# Altium footprint library ICL_komponenty_v1.PcbLib: 160 footprints (part 6 of 10)
Each footprint in its own frame and in the unit in brackets; x right, y up, seen from the top. Pads: shape width x height; smd on the part's side, far side on the other; paste and mask are expansions set on the pad; w line width, h text height; cw(c..) or ccw(c..) is an arc to the next point about the centre after c.
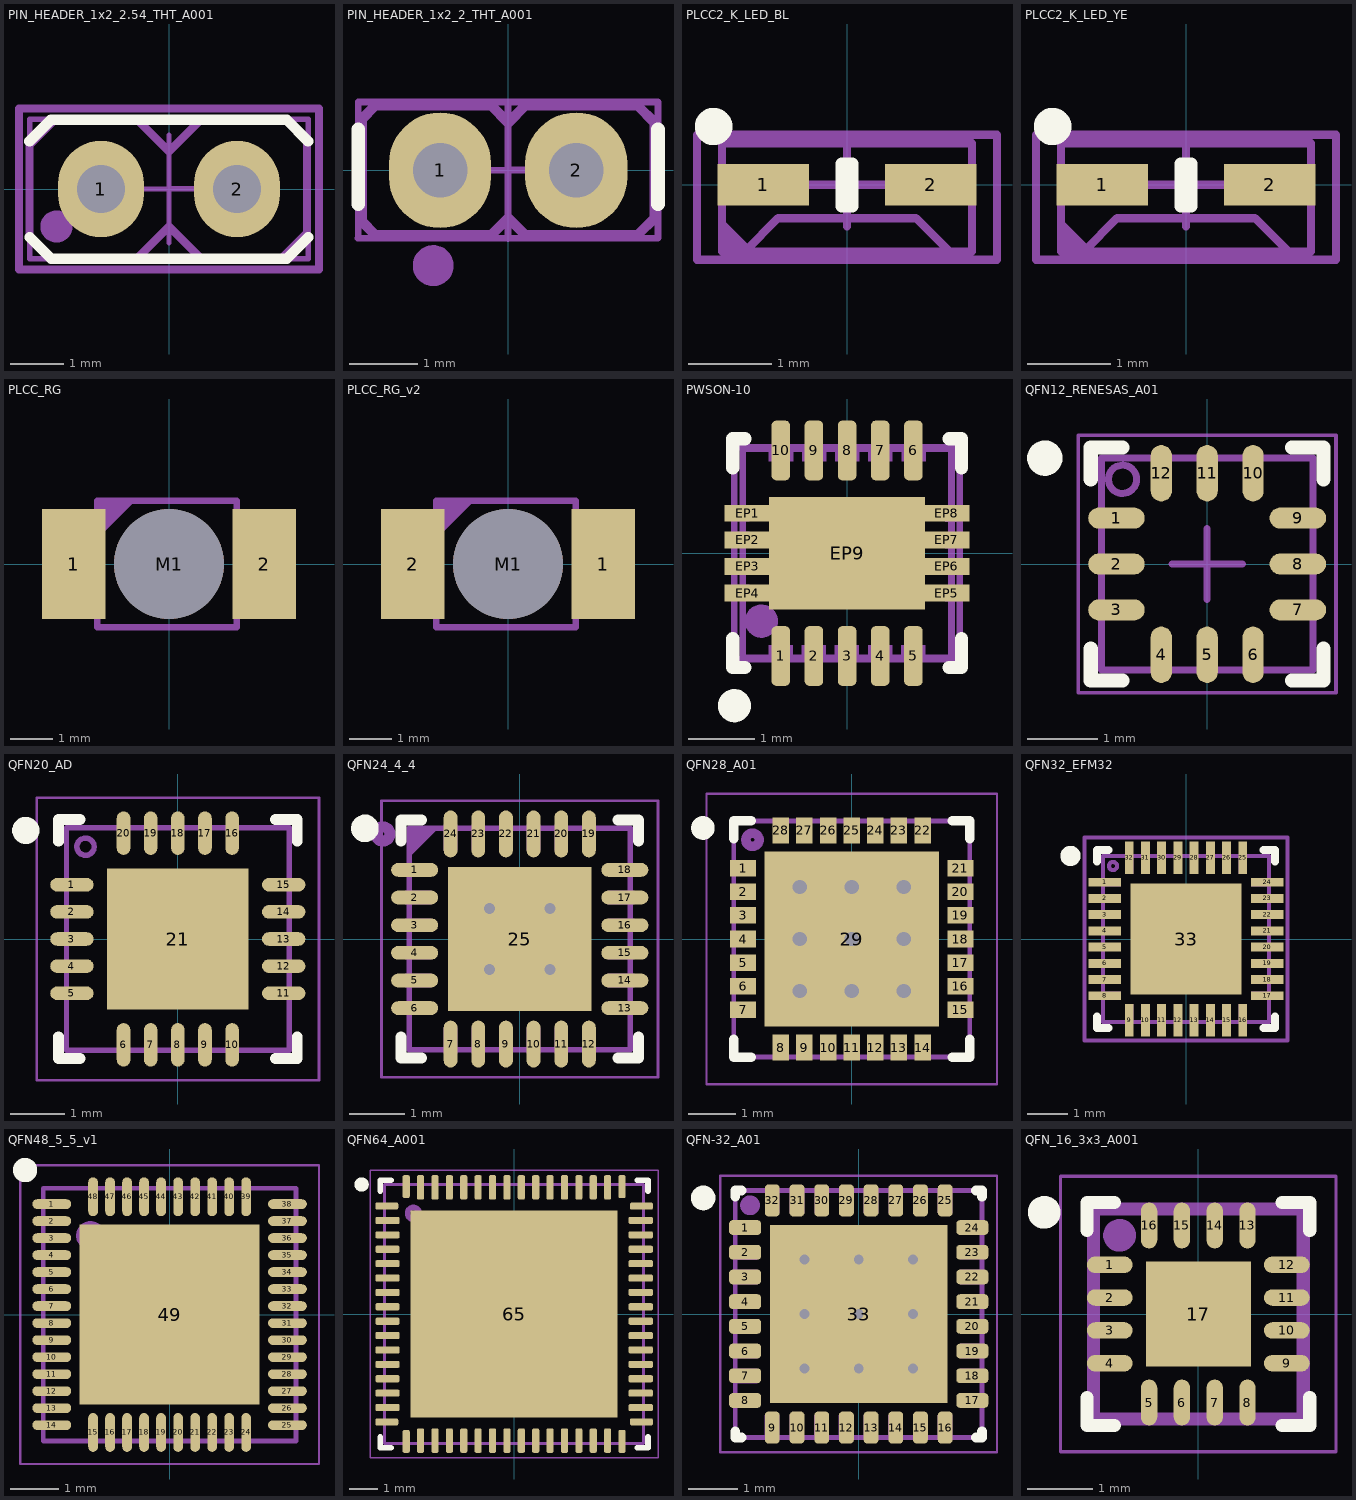
[diagram p5: the footprints below, top view; thin cyan lines are the x and y axes]

## PIN_HEADER_1x2_2.54_THT_A001 [mm]
pads (2):
  oval 1.6x1.8 hole 0.9: 1(-1.27,0) 2(1.27,0)
Top Overlay:
  lines w0.2: -2.603,0.893 -2.203,1.293 2.197,1.293 2.597,0.893 ; -2.6,-0.9 -2.2,-1.3 2.2,-1.3 2.6,-0.9
Top M15-16_SORG:
  lines w0.1: -1,0 0,0 ; 0,-1 0,0 ; 0,1 0,0 ; 0.009,0.004 1.009,0.004 ; -2.6,-1.3 2.6,-1.3 2.6,1.3 -2.6,1.3 -2.6,-1.3
Top M17-18_TDES:
  text "'.Designator'" at -5.465,2.483 h1
Top M19-20_TMOT:
  circle w0.3: c-2.1,-0.7 r0.15
  lines w0.15: 2.578,-0.823 2.102,-1.3 0.6,-1.3 0,-0.7 -0.6,-1.3 -2.2,-1.3 -2.6,-0.9 -2.6,0.823 -2.123,1.3 -0.6,1.3 0,0.7 0.6,1.3 2.2,1.3 2.579,0.921 2.579,-0.823 ; -1.708,-0.412 -1.708,0.388 ; -1.708,-0.412 -0.908,0.388 ; -1.708,-0.412 -0.908,-0.412 ; -1.708,0.388 -0.908,-0.412 ; -1.708,0.388 -0.908,0.388 ; -0.908,-0.412 -0.908,0.388 ; 0.875,-0.406 0.875,0.394 ; 0.875,-0.406 1.675,0.394 ; 0.875,-0.406 1.675,-0.406 ; 0.875,0.394 1.675,-0.406 ; 0.875,0.394 1.675,0.394 ; 1.675,-0.406 1.675,0.394 ; -2.8,-1.5 2.8,-1.5 2.8,1.5 -2.8,1.5 -2.8,-1.5
3D body "pin_header_1x2_2mm_THT.stp": height 8.55, standoff -2.99, extent -2.54,-1.27 2.54,1.27

## PIN_HEADER_1x2_2_THT_A001 [mm]
pads (2):
  oval 1.5x1.7 hole 0.8: 1(-1,0) 2(1,0)
Top Overlay:
  lines w0.2: -2.2,-0.5 -2.2,0.6 ; 2.2,-0.5 2.2,0.6
Top M15-16_SORG:
  lines w0.1: -2.204,-0.999 2.196,-0.999 ; -2.2,-0.995 -2.2,1 2.2,1 2.2,-0.995 ; -1,0 0,0 ; 0,-1 0,0 ; 0,1 0,0 ; 0.009,0.004 1.009,0.004
Top M17-18_TDES:
  text "'.Designator'" at -5.565,1.733 h1
Top M19-20_TMOT:
  circle w0.3: c-1.1,-1.4 r0.15
  lines w0.15: -1.4,-0.4 -1.4,0.4 ; -1.4,-0.4 -0.6,0.4 ; -1.4,-0.4 -0.6,-0.4 ; -1.4,0.4 -0.6,-0.4 ; -1.4,0.4 -0.6,0.4 ; -0.6,-0.4 -0.6,0.4 ; 0.6,-0.4 0.6,0.4 ; 0.6,-0.4 1.4,0.4 ; 0.6,-0.4 1.4,-0.4 ; 0.6,0.4 1.4,-0.4 ; 0.6,0.4 1.4,0.4 ; 1.4,-0.4 1.4,0.4 ; -2.15,-0.75 -2.15,0.75 -1.95,0.95 -0.25,0.95 0,0.7 0.25,0.95 1.9,0.95 2.15,0.7 2.15,-0.7 1.9,-0.95 0.25,-0.95 0,-0.7 -0.25,-0.95 -1.95,-0.95 -2.15,-0.75
3D body "2pin_jumper_62000211121.stp": height 6.01, standoff -2.69, extent -2,-1 2,1

## PLCC2_K_LED_BL [mm] "PLCC2 angle Blue"
height 0.381
pads (2):
  rect 1.1x0.5 smd: 1(-1.005,0) 2(1.005,0)
Top Overlay:
  circle w0.25: c-1.6,0.7 r0.1
  lines w0.152: -0.064,-0.254 0.064,-0.254 0.064,0.254 -0.064,0.254 -0.064,-0.254
Top M11-12_SMOT:
  region: -1.1,-0.8 -1.5,-0.4 -1.5,-0.8
  lines w0.1: -1.226,-0.8 -0.826,-0.4 0.826,-0.4 1.216,-0.789 1.216,-0.8 ; -1.5,-0.8 -1.5,0.5 1.5,0.5 1.5,-0.8 -1.5,-0.8
Top M13-14_SDES:
  text "'.Designator'" at -2.832,-0.208 h0.5
Top M15-16_SORG:
  lines w0.1: -0.5,0 0.5,0 ; 0,-0.5 0,0.5 ; -1.8,-0.9 -1.8,0.6 1.8,0.6 1.8,-0.9 -1.8,-0.9
3D body "PLCC2-3_1x1_4_BL.stp": height 1.54, standoff 0.01, extent -1.55,-0.8 1.55,0.4

## PLCC2_K_LED_YE [mm] "PLCC2 angle yelow"
height 0.381
pads (2):
  rect 1.1x0.5 smd: 1(-1.005,0) 2(1.005,0)
Top Overlay:
  circle w0.25: c-1.6,0.7 r0.1
  lines w0.152: -0.064,-0.254 -0.064,0.254 0.064,0.254 0.064,-0.254 -0.064,-0.254
Top M11-12_SMOT:
  region: -1.1,-0.8 -1.5,-0.4 -1.5,-0.8
  lines w0.1: -1.226,-0.8 -0.826,-0.4 0.826,-0.4 1.216,-0.789 1.216,-0.8 ; -1.5,-0.8 1.5,-0.8 1.5,0.5 -1.5,0.5 -1.5,-0.8
Top M13-14_SDES:
  text "'.Designator'" at -2.832,-0.208 h0.5
Top M15-16_SORG:
  lines w0.1: -0.5,0 0.5,0 ; 0,-0.5 0,0.5 ; -1.8,-0.9 1.8,-0.9 1.8,0.6 -1.8,0.6 -1.8,-0.9
3D body "PLCC2-3_1x1_4_YE.stp": height 1.54, standoff 0.01, extent -1.55,-0.8 1.55,0.4

## PLCC_RG [mm] "reverse mounting PLCC"
pads (3):
  rect 1.5x2.6 smd: 1(-2.25,0) 2(2.25,0)
  round 2.6 hole 2.6 unplated: M1(0,0)
Top M11-12_SMOT:
  circle w0.1: c0,0 r1.2
  region: -1.7,1.2 -2.5,1.2 -2.5,-1.2 -1.7,-1.2
  rectangle: 1.6,-1.2 2.5,1.2
  region: -1.7,1.5 -0.8,1.5 -1.7,0.6
  lines w0.15: -1.7,-1.5 1.6,-1.5 1.6,1.5 -1.7,1.5 -1.7,-1.5
Top M13-14_SDES:
  text "'.Designator'" at 0.25,-3.399 h0.6
Top M15-16_SORG:
  lines w0.1: -1,0 0,0 ; 0,-1 0,0 ; 0,1 0,0 ; 1,0 0,0
3D body "SFH_3211FA.STEP": height 1.84, standoff 0.01, extent -2.6,-1.4 2.6,1.4

## PLCC_RG_v2 [mm] "reverse mounting PLCC IR"
pads (3):
  rect 1.5x2.6 smd: 1(2.25,0) 2(-2.25,0)
  round 2.6 hole 2.6 unplated: M1(0,0)
Top M11-12_SMOT:
  circle w0.1: c0,0 r1.2
  rectangle: 1.6,-1.2 2.5,1.2
  region: -1.7,1.2 -2.5,1.2 -2.5,-1.2 -1.7,-1.2
  region: -1.7,1.5 -0.8,1.5 -1.7,0.6
  lines w0.15: -1.7,-1.5 -1.7,1.5 1.6,1.5 1.6,-1.5 -1.7,-1.5
Top M13-14_SDES:
  text "'.Designator'" at 0.25,-3.399 h0.6
Top M15-16_SORG:
  lines w0.1: -1,0 0,0 ; 0,-1 0,0 ; 0,1 0,0 ; 1,0 0,0
3D body "SFH_4253_R.STEP": height 1.84, standoff 0.01, extent -2.6,-1.4 2.6,1.4

## PWSON-10 [mm]
height 0.8
pads (19):
  rrect50% 0.28x0.9 smd: 1(-1,-1.55) 2(-0.5,-1.55) 3(0,-1.55) 4(0.5,-1.55) 5(1,-1.55) 6(1,1.55) 7(0.5,1.55) 8(0,1.55) 9(-0.5,1.55) 10(-1,1.55)
  rect 0.7x0.25 smd paste-0.2: EP1(-1.5,0.6) EP2(-1.5,0.2) EP3(-1.5,-0.2) EP4(-1.5,-0.6) EP5(1.5,-0.6) EP6(1.5,-0.2) EP7(1.5,0.2) EP8(1.5,0.6)
  rect 2.35x1.7 smd paste-1.2: EP9(0,0)
Top Overlay:
  circle w0.25: c-1.7,-2.3 r0.125
  lines w0.2: -1.725,-1.29 -1.725,-1.725 -1.54,-1.725 ; -1.725,1.29 -1.725,1.725 -1.54,1.725 ; 1.54,-1.725 1.725,-1.725 1.725,-1.29 ; 1.54,1.725 1.725,1.725 1.725,1.29
Top Paste:
  rectangle: -0.988,0.1 -0.1,0.7
  region: 0.988,-0.1 0.1,-0.1 0.1,-0.7 0.988,-0.7
  region: 0.988,0.7 0.1,0.7 0.1,0.1 0.988,0.1
  rectangle: -0.988,-0.7 -0.1,-0.1
  rectangle: 1.21,0.481 1.796,0.723
  rectangle: 1.21,0.081 1.796,0.323
  rectangle: 1.21,-0.319 1.796,-0.077
  rectangle: 1.21,-0.719 1.796,-0.477
  rectangle: -1.79,0.481 -1.204,0.723
  rectangle: -1.79,0.081 -1.204,0.323
  rectangle: -1.79,-0.319 -1.204,-0.077
  rectangle: -1.79,-0.719 -1.204,-0.477
Top Solder:
  rectangle: -1,1 1,2.1
  rectangle: -1,-2.1 1,-1
  rectangle: -1.174,-1.243 1.168,-0.676
  rectangle: -1.149,0.638 1.177,1.406
  lines w0.2: -1.594,-0.725 cw(c-1.594,-1.175) -1.144,-1.175 ; -1.589,0.722 ccw(c-1.589,1.172) -1.139,1.172 ; 1.139,-1.172 cw(c1.589,-1.172) 1.589,-0.722 ; 1.141,1.186 ccw(c1.591,1.186) 1.591,0.736
Top M11-12_SMOT:
  circle w0.25: c-1.292,-1.025 r0.125
  rectangle: -0.183,1.381 0.188,1.6
  region: 0.183,-1.381 -0.188,-1.381 -0.188,-1.6 0.183,-1.6
  region: 1.474,0.32 1.474,0.071 1.692,0.071 1.692,0.32
  region: 1.474,0.72 1.474,0.471 1.692,0.471 1.692,0.72
  rectangle: 0.817,1.381 1.188,1.6
  rectangle: 0.317,1.381 0.688,1.6
  region: 1.474,-0.48 1.474,-0.729 1.692,-0.729 1.692,-0.48
  region: 1.474,-0.08 1.474,-0.329 1.692,-0.329 1.692,-0.08
  region: 0.683,-1.381 0.312,-1.381 0.312,-1.6 0.683,-1.6
  region: 1.183,-1.381 0.812,-1.381 0.812,-1.6 1.183,-1.6
  region: -1.474,0.08 -1.474,0.329 -1.692,0.329 -1.692,0.08
  region: -1.474,0.48 -1.474,0.729 -1.692,0.729 -1.692,0.48
  rectangle: -0.683,1.381 -0.312,1.6
  rectangle: -1.183,1.381 -0.812,1.6
  region: -1.474,-0.72 -1.474,-0.471 -1.692,-0.471 -1.692,-0.72
  region: -1.474,-0.32 -1.474,-0.071 -1.692,-0.071 -1.692,-0.32
  region: -0.817,-1.381 -1.188,-1.381 -1.188,-1.6 -0.817,-1.6
  region: -0.317,-1.381 -0.688,-1.381 -0.688,-1.6 -0.317,-1.6
  lines w0.1: -1.7,-1.6 1.7,-1.6 1.7,1.6 -1.7,1.6 -1.7,-1.6
Top M13-14_SDES:
  text "'.Designator'" at -4.532,-0.333 h0.8
Top M15-16_SORG:
  lines w0.1: -0.5,0 0.5,0 ; 0,-0.5 0,0.5 ; -1.575,-1.575 1.575,-1.575 1.575,1.575 -1.575,1.575 -1.575,-1.575
3D body "PWSON-10.step": height 0.8, standoff 0, extent -1.576,-1.576 1.576,1.576

## QFN12_RENESAS_A01 [mm]
height 0.72
pads (12):
  oval 0.8x0.3 smd: 1(-1.285,0.65) 2(-1.285,0) 3(-1.285,-0.65) 7(1.285,-0.65) 8(1.285,0) 9(1.285,0.65)
  oval 0.3x0.8 smd: 4(-0.65,-1.285) 5(0,-1.285) 6(0.65,-1.285) 10(0.65,1.285) 11(0,1.285) 12(-0.65,1.285)
Top Overlay:
  circle w0.25: c-2.3,1.5 r0.125
  lines w0.2: -1.65,-1.2 -1.65,-1.65 -1.2,-1.65 ; -1.65,1.2 -1.65,1.65 -1.2,1.65 ; 1.2,-1.65 1.65,-1.65 1.65,-1.2 ; 1.2,1.65 1.65,1.65 1.65,1.2
Top M11-12_SMOT:
  circle w0.1: c-1.2,1.2 r0.2
  rectangle: -0.772,1.03 -0.531,1.5
  rectangle: -0.122,1.03 0.119,1.5
  rectangle: 0.528,1.03 0.769,1.5
  region: 1.03,0.772 1.03,0.531 1.5,0.531 1.5,0.772
  region: 1.03,0.122 1.03,-0.119 1.5,-0.119 1.5,0.122
  region: 1.03,-0.528 1.03,-0.769 1.5,-0.769 1.5,-0.528
  rectangle: 0.528,-1.54 0.769,-1.07
  rectangle: -0.122,-1.54 0.119,-1.07
  rectangle: -0.772,-1.54 -0.531,-1.07
  region: -1.54,-0.528 -1.54,-0.769 -1.07,-0.769 -1.07,-0.528
  region: -1.54,0.122 -1.54,-0.119 -1.07,-0.119 -1.07,0.122
  region: -1.54,0.772 -1.54,0.531 -1.07,0.531 -1.07,0.772
  lines w0.1: -1.5,-1.5 1.5,-1.5 1.5,1.5 -1.5,1.5 -1.5,-1.5
Top M13-14_SDES:
  text "'.Designator'" at -3.965,2.408 h0.7
Top M15-16_SORG:
  lines w0.05: -1.825,-1.825 1.825,-1.825 1.825,1.825 -1.825,1.825 -1.825,-1.825
  lines w0.1: -0.5,0 0.5,0 ; 0,-0.5 0,0.5
3D body "QFN127_RENESAS_A01.step": height 0.72, standoff 0, extent -1.537,-1.537 1.537,1.537

## QFN20_AD [mm] "AD8232"
height 0.8
pads (21):
  oval 0.8x0.25 smd: 1(-1.95,1) 2(-1.95,0.5) 3(-1.95,0) 4(-1.95,-0.5) 5(-1.95,-1) 11(1.95,-1) 12(1.95,-0.5) 13(1.95,0) 14(1.95,0.5) 15(1.95,1)
  oval 0.25x0.8 smd: 6(-1,-1.95) 7(-0.5,-1.95) 8(0,-1.95) 9(0.5,-1.95) 10(1,-1.95) 16(1,1.95) 17(0.5,1.95) 18(0,1.95) 19(-0.5,1.95) 20(-1,1.95)
  rect 2.6x2.6 smd: 21(0,0)
Top Overlay:
  circle w0.25: c-2.8,2 r0.125
  lines w0.2: -2.2,-1.8 -2.2,-2.2 -1.8,-2.2 ; -2.2,1.8 -2.2,2.2 -1.8,2.2 ; 1.8,-2.2 2.2,-2.2 2.2,-1.8 ; 1.8,2.2 2.2,2.2 2.2,1.8
Top M11-12_SMOT:
  circle w0.1: c-1.7,1.7 r0.158
  rectangle: -0.8,-0.7 0.7,0.7
  region: 1.6,1.1 1.6,0.9 2.05,0.9 2.05,1.1
  region: 1.6,0.6 1.6,0.4 2.05,0.4 2.05,0.6
  region: 1.6,0.1 1.6,-0.1 2.05,-0.1 2.05,0.1
  region: 1.6,-0.4 1.6,-0.6 2.05,-0.6 2.05,-0.4
  region: 1.6,-0.9 1.6,-1.1 2.05,-1.1 2.05,-0.9
  region: 1.1,-1.6 0.9,-1.6 0.9,-2.05 1.1,-2.05
  region: 0.6,-1.6 0.4,-1.6 0.4,-2.05 0.6,-2.05
  region: 0.1,-1.6 -0.1,-1.6 -0.1,-2.05 0.1,-2.05
  region: -0.4,-1.6 -0.6,-1.6 -0.6,-2.05 -0.4,-2.05
  region: -0.9,-1.6 -1.1,-1.6 -1.1,-2.05 -0.9,-2.05
  region: -1.6,-1.1 -1.6,-0.9 -2.05,-0.9 -2.05,-1.1
  region: -1.6,-0.6 -1.6,-0.4 -2.05,-0.4 -2.05,-0.6
  region: -1.6,-0.1 -1.6,0.1 -2.05,0.1 -2.05,-0.1
  region: -1.6,0.4 -1.6,0.6 -2.05,0.6 -2.05,0.4
  region: -1.6,0.9 -1.6,1.1 -2.05,1.1 -2.05,0.9
  rectangle: 0.9,1.6 1.1,2.05
  rectangle: 0.4,1.6 0.6,2.05
  rectangle: -0.1,1.6 0.1,2.05
  rectangle: -0.6,1.6 -0.4,2.05
  rectangle: -1.1,1.6 -0.9,2.05
  lines w0.1: -2.05,-2.05 2.05,-2.05 2.05,2.05 -2.05,2.05 -2.05,-2.05
Top M13-14_SDES:
  text "'.Designator'" at -3.399,0.85 h0.6
Top M15-16_SORG:
  lines w0.05: -2.6,-2.6 2.6,-2.6 2.6,2.6 -2.6,2.6 -2.6,-2.6
  lines w0.1: -0.5,0 0.5,0 ; 0,-0.5 0,0.5
3D body "QFN20_AD.step": height 0.8, standoff 0, extent -2.07,-2.07 2.07,2.07

## QFN24_4_4 [mm] "QFN, 24-Leads, Body 4,00x4,00mm, Pitch 0,50mm, Thermal Pad 2,60x2,60mm, IPC Medium Density"
height 0.9
pads (25):
  oval 0.85x0.25 smd: 1(-1.9,1.25) 2(-1.9,0.75) 3(-1.9,0.25) 4(-1.9,-0.25) 5(-1.9,-0.75) 6(-1.9,-1.25) 13(1.9,-1.25) 14(1.9,-0.75) 15(1.9,-0.25) 16(1.9,0.25) 17(1.9,0.75) 18(1.9,1.25)
  oval 0.25x0.85 smd: 7(-1.25,-1.9) 8(-0.75,-1.9) 9(-0.25,-1.9) 10(0.25,-1.9) 11(0.75,-1.9) 12(1.25,-1.9) 19(1.25,1.9) 20(0.75,1.9) 21(0.25,1.9) 22(-0.25,1.9) 23(-0.75,1.9) 24(-1.25,1.9)
  rect 2.6x2.6 smd: 25(0,0)
via 0.55,-0.55 diameter 0.5 hole 0.2
via -0.55,-0.55 diameter 0.5 hole 0.2
via 0.55,0.55 diameter 0.5 hole 0.2
via -0.55,0.55 diameter 0.5 hole 0.2
Top Overlay:
  circle w0.25: c-2.8,2 r0.125
  lines w0.2: -2.15,-1.775 -2.15,-2.15 -1.775,-2.15 ; -2.15,1.775 -2.15,2.15 -1.775,2.15 ; 1.775,-2.15 2.15,-2.15 2.15,-1.775 ; 1.775,2.15 2.15,2.15 2.15,1.775
Top M11-12_SMOT:
  circle w0.2: c-2.475,1.9 r0.127
  rectangle: -1.375,1.6 -1.125,2.075
  rectangle: -0.875,1.6 -0.625,2.075
  rectangle: -0.375,1.6 -0.125,2.075
  rectangle: 0.125,1.6 0.375,2.075
  rectangle: 0.625,1.6 0.875,2.075
  rectangle: 1.125,1.6 1.375,2.075
  region: 1.6,1.375 1.6,1.125 2.075,1.125 2.075,1.375
  region: 1.6,0.875 1.6,0.625 2.075,0.625 2.075,0.875
  region: 1.6,0.375 1.6,0.125 2.075,0.125 2.075,0.375
  region: 1.6,-0.125 1.6,-0.375 2.075,-0.375 2.075,-0.125
  region: 1.6,-0.625 1.6,-0.875 2.075,-0.875 2.075,-0.625
  region: 1.6,-1.125 1.6,-1.375 2.075,-1.375 2.075,-1.125
  region: 1.375,-1.6 1.125,-1.6 1.125,-2.075 1.375,-2.075
  region: 0.875,-1.6 0.625,-1.6 0.625,-2.075 0.875,-2.075
  region: 0.375,-1.6 0.125,-1.6 0.125,-2.075 0.375,-2.075
  region: -0.125,-1.6 -0.375,-1.6 -0.375,-2.075 -0.125,-2.075
  region: -0.625,-1.6 -0.875,-1.6 -0.875,-2.075 -0.625,-2.075
  region: -1.125,-1.6 -1.375,-1.6 -1.375,-2.075 -1.125,-2.075
  region: -1.6,-1.375 -1.6,-1.125 -2.075,-1.125 -2.075,-1.375
  region: -1.6,-0.875 -1.6,-0.625 -2.075,-0.625 -2.075,-0.875
  region: -1.6,-0.375 -1.6,-0.125 -2.075,-0.125 -2.075,-0.375
  region: -1.6,0.125 -1.6,0.375 -2.075,0.375 -2.075,0.125
  region: -1.6,0.625 -1.6,0.875 -2.075,0.875 -2.075,0.625
  region: -1.6,1.125 -1.6,1.375 -2.075,1.375 -2.075,1.125
  region: -2,2 -1.475,2 -1.999,1.476
  lines w0.1: -2,-2 2,-2 2,2 -2,2 -2,-2
Top M13-14_SDES:
  text "'.Designator'" at -3.399,-0.175 h0.6
Top M15-16_SORG:
  lines w0.05: -2.5,-2.5 2.5,-2.5 2.5,2.5 -2.5,2.5 -2.5,-2.5
  lines w0.1: -0.5,0 0.5,0 ; 0,-0.5 0,0.5
3D body "QFN24_4_4_b.step": height 0.9, standoff 0, extent -2.01,-2.01 2.01,2.01

## QFN28_A01 [mm] "Trinamic TMC2209"
height 0.9
pads (29):
  rect 0.55x0.35 smd: 1(-2.3,1.5) 2(-2.3,1) 3(-2.3,0.5) 4(-2.3,0) 5(-2.3,-0.5) 6(-2.3,-1) 7(-2.3,-1.5) 15(2.3,-1.5) 16(2.3,-1) 17(2.3,-0.5) 18(2.3,0) 19(2.3,0.5) 20(2.3,1) 21(2.3,1.5)
  rect 0.35x0.55 smd: 8(-1.5,-2.3) 9(-1,-2.3) 10(-0.5,-2.3) 11(0,-2.3) 12(0.5,-2.3) 13(1,-2.3) 14(1.5,-2.3) 22(1.5,2.3) 23(1,2.3) 24(0.5,2.3) 25(0,2.3) 26(-0.5,2.3) 27(-1,2.3) 28(-1.5,2.3)
  rect 3.7x3.7 smd paste-1.85: 29(0,0)
via -1.1,1.1 diameter 0.6 hole 0.3
via 0,1.1 diameter 0.6 hole 0.3
via 1.1,1.1 diameter 0.6 hole 0.3
via -1.1,0 diameter 0.6 hole 0.3
via 0,0 diameter 0.6 hole 0.3
via 1.1,0 diameter 0.6 hole 0.3
via -1.1,-1.1 diameter 0.6 hole 0.3
via 0,-1.1 diameter 0.6 hole 0.3
via 1.1,-1.1 diameter 0.6 hole 0.3
Top Overlay:
  circle w0.25: c-3.15,2.35 r0.125
  lines w0.2: -2.5,-2.125 -2.5,-2.5 -2.125,-2.5 ; -2.5,2.125 -2.5,2.5 -2.125,2.5 ; 2.125,-2.5 2.5,-2.5 2.5,-2.125 ; 2.125,2.5 2.5,2.5 2.5,2.125
Top Paste:
  region: 0.65,-0.65 0.65,-1.55 1.55,-1.55 1.55,-0.65
  region: -0.45,-0.65 -0.45,-1.55 0.45,-1.55 0.45,-0.65
  region: -1.55,-0.65 -1.55,-1.55 -0.65,-1.55 -0.65,-0.65
  region: -1.55,0.45 -1.55,-0.45 -0.65,-0.45 -0.65,0.45
  region: -1.55,1.55 -1.55,0.65 -0.65,0.65 -0.65,1.55
  region: 0.65,1.55 0.65,0.65 1.55,0.65 1.55,1.55
  region: -0.45,1.55 -0.45,0.65 0.45,0.65 0.45,1.55
  region: -0.45,0.45 -0.45,-0.45 0.45,-0.45 0.45,0.45
  region: 0.65,0.45 0.65,-0.45 1.55,-0.45 1.55,0.45
Top Solder:
  rectangle: -1.775,1.775 1.775,2.675
  rectangle: 1.775,-1.775 2.675,1.775
  rectangle: -1.775,-2.675 1.775,-1.775
  rectangle: -2.675,-1.775 -1.775,1.775
  rectangle: -1.95,-1.95 1.95,1.95
Top M11-12_SMOT:
  circle w0.2: c-2.1,2.1 r0.141
  region: -1.65,2.5 -1.65,2.05 -1.35,2.05 -1.35,2.5
  region: -1.15,2.5 -1.15,2.05 -0.85,2.05 -0.85,2.5
  region: -0.65,2.5 -0.65,2.05 -0.35,2.05 -0.35,2.5
  region: -0.15,2.5 -0.15,2.05 0.15,2.05 0.15,2.5
  region: 0.35,2.5 0.35,2.05 0.65,2.05 0.65,2.5
  region: 0.85,2.5 0.85,2.05 1.15,2.05 1.15,2.5
  region: 1.35,2.5 1.35,2.05 1.65,2.05 1.65,2.5
  rectangle: -2.5,-1.65 -2.05,-1.35
  rectangle: -2.5,-1.15 -2.05,-0.85
  rectangle: -2.5,-0.65 -2.05,-0.35
  rectangle: -2.5,-0.15 -2.05,0.15
  rectangle: -2.5,0.35 -2.05,0.65
  rectangle: -2.5,0.85 -2.05,1.15
  rectangle: -2.5,1.35 -2.05,1.65
  region: 1.65,-2.5 1.65,-2.05 1.35,-2.05 1.35,-2.5
  region: 1.15,-2.5 1.15,-2.05 0.85,-2.05 0.85,-2.5
  region: 0.65,-2.5 0.65,-2.05 0.35,-2.05 0.35,-2.5
  region: 0.15,-2.5 0.15,-2.05 -0.15,-2.05 -0.15,-2.5
  region: -0.35,-2.5 -0.35,-2.05 -0.65,-2.05 -0.65,-2.5
  region: -0.85,-2.5 -0.85,-2.05 -1.15,-2.05 -1.15,-2.5
  region: -1.35,-2.5 -1.35,-2.05 -1.65,-2.05 -1.65,-2.5
  region: 2.5,1.65 2.05,1.65 2.05,1.35 2.5,1.35
  region: 2.5,1.15 2.05,1.15 2.05,0.85 2.5,0.85
  region: 2.5,0.65 2.05,0.65 2.05,0.35 2.5,0.35
  region: 2.5,0.15 2.05,0.15 2.05,-0.15 2.5,-0.15
  region: 2.5,-0.35 2.05,-0.35 2.05,-0.65 2.5,-0.65
  region: 2.5,-0.85 2.05,-0.85 2.05,-1.15 2.5,-1.15
  region: 2.5,-1.35 2.05,-1.35 2.05,-1.65 2.5,-1.65
  rectangle: -1.5,-1.5 1.5,1.5
  lines w0.1: -2.5,-2.5 2.5,-2.5 2.5,2.5 -2.5,2.5 -2.5,-2.5
Top M13-14_SDES:
  text "'.Designator'" at -3.399,-0.175 h0.6
Top M15-16_SORG:
  lines w0.05: -3.075,-3.075 -3.075,3.075 3.075,3.075 3.075,-3.075 -3.075,-3.075
  lines w0.1: -0.5,0 0.5,0 ; 0,-0.5 0,0.5
3D body "QFN28_A01.step": height 0.9, standoff 0, extent -2.5,-2.5 2.5,2.5

## QFN32_EFM32 [mm] "Silicon Labs"
height 0.33
pads (33):
  rect 0.8x0.22 smd paste-0.035 mask+0.05: 1(-2,1.4) 2(-2,1) 3(-2,0.6) 4(-2,0.2) 5(-2,-0.2) 6(-2,-0.6) 7(-2,-1) 8(-2,-1.4) 17(2,-1.4) 18(2,-1) 19(2,-0.6) 20(2,-0.2) 21(2,0.2) 22(2,0.6) 23(2,1) 24(2,1.4)
  rect 0.22x0.8 smd paste-0.035 mask+0.05: 9(-1.4,-2) 10(-1,-2) 11(-0.6,-2) 12(-0.2,-2) 13(0.2,-2) 14(0.6,-2) 15(1,-2) 16(1.4,-2) 25(1.4,2) 26(1,2) 27(0.6,2) 28(0.2,2) 29(-0.2,2) 30(-0.6,2) 31(-1,2) 32(-1.4,2)
  rect 2.75x2.75 smd paste-1.4 mask+0.05: 33(0,0)
Top Overlay:
  circle w0.25: c-2.85,2.05 r0.125
  lines w0.2: -2.2,-1.91 -2.2,-2.2 -1.91,-2.2 ; -2.2,1.91 -2.2,2.2 -1.91,2.2 ; 1.91,-2.2 2.2,-2.2 2.2,-1.91 ; 1.91,2.2 2.2,2.2 2.2,1.91
Top Paste:
  region: -0.2,-0.2 -1.2,-0.2 -1.2,-1.2 -0.2,-1.2
  region: 1.2,-0.2 0.2,-0.2 0.2,-1.2 1.2,-1.2
  rectangle: 0.2,0.2 1.2,1.2
  rectangle: -1.2,0.2 -0.2,1.2
Top Solder:
  rectangle: -1.7,1.55 1.7,2.45
  region: -1.55,-1.7 -1.55,1.7 -2.45,1.7 -2.45,-1.7
  region: 1.7,-1.55 -1.7,-1.55 -1.7,-2.45 1.7,-2.45
  region: 1.55,1.7 1.55,-1.7 2.45,-1.7 2.45,1.7
Top M11-12_SMOT:
  circle w0.1: c-1.8,1.8 r0.1
  region: 1.6,-1.3 1.6,-1.5 2.05,-1.5 2.05,-1.3
  region: 1.6,-0.9 1.6,-1.1 2.05,-1.1 2.05,-0.9
  region: 1.6,-0.5 1.6,-0.7 2.05,-0.7 2.05,-0.5
  region: 1.6,-0.1 1.6,-0.3 2.05,-0.3 2.05,-0.1
  region: 1.6,0.3 1.6,0.1 2.05,0.1 2.05,0.3
  region: 1.6,0.7 1.6,0.5 2.05,0.5 2.05,0.7
  region: 1.6,1.1 1.6,0.9 2.05,0.9 2.05,1.1
  region: 1.6,1.5 1.6,1.3 2.05,1.3 2.05,1.5
  region: -1.3,-1.6 -1.5,-1.6 -1.5,-2.05 -1.3,-2.05
  region: -0.9,-1.6 -1.1,-1.6 -1.1,-2.05 -0.9,-2.05
  region: -0.5,-1.6 -0.7,-1.6 -0.7,-2.05 -0.5,-2.05
  region: -0.1,-1.6 -0.3,-1.6 -0.3,-2.05 -0.1,-2.05
  region: 0.3,-1.6 0.1,-1.6 0.1,-2.05 0.3,-2.05
  region: 0.7,-1.6 0.5,-1.6 0.5,-2.05 0.7,-2.05
  region: 1.1,-1.6 0.9,-1.6 0.9,-2.05 1.1,-2.05
  region: 1.5,-1.6 1.3,-1.6 1.3,-2.05 1.5,-2.05
  region: -1.6,1.3 -1.6,1.5 -2.05,1.5 -2.05,1.3
  region: -1.6,0.9 -1.6,1.1 -2.05,1.1 -2.05,0.9
  region: -1.6,0.5 -1.6,0.7 -2.05,0.7 -2.05,0.5
  region: -1.6,0.1 -1.6,0.3 -2.05,0.3 -2.05,0.1
  region: -1.6,-0.3 -1.6,-0.1 -2.05,-0.1 -2.05,-0.3
  region: -1.6,-0.7 -1.6,-0.5 -2.05,-0.5 -2.05,-0.7
  region: -1.6,-1.1 -1.6,-0.9 -2.05,-0.9 -2.05,-1.1
  region: -1.6,-1.5 -1.6,-1.3 -2.05,-1.3 -2.05,-1.5
  rectangle: 1.3,1.6 1.5,2.05
  rectangle: 0.9,1.6 1.1,2.05
  rectangle: 0.5,1.6 0.7,2.05
  rectangle: 0.1,1.6 0.3,2.05
  rectangle: -0.3,1.6 -0.1,2.05
  rectangle: -0.7,1.6 -0.5,2.05
  rectangle: -1.1,1.6 -0.9,2.05
  rectangle: -1.5,1.6 -1.3,2.05
  lines w0.1: -2.05,-2.05 2.05,-2.05 2.05,2.05 -2.05,2.05 -2.05,-2.05
Top M13-14_SDES:
  text "'.Designator'" at -4.532,-0.333 h0.8
Top M15-16_SORG:
  lines w0.1: -0.5,0 0.5,0 ; 0,-0.5 0,0.5 ; -2.5,-2.5 2.5,-2.5 2.5,2.5 -2.5,2.5 -2.5,-2.5
3D body "QFN32_EFM32.step": height 0.33, standoff 0, extent -2.06,-2.06 2.06,2.06

## QFN48_5_5_v1 [mm] "QFN48 5x5"
height 0.9
pads (49):
  oval 0.8x0.2 smd: 1(-2.425,2.275) 2(-2.425,1.925) 3(-2.425,1.575) 4(-2.425,1.225) 5(-2.425,0.875) 6(-2.425,0.525) 7(-2.425,0.175) 8(-2.425,-0.175) 9(-2.425,-0.525) 10(-2.425,-0.875) 11(-2.425,-1.225) 12(-2.425,-1.575) 13(-2.425,-1.925) 14(-2.425,-2.275) 25(2.425,-2.275) 26(2.425,-1.925) 27(2.425,-1.575) 28(2.425,-1.225) 29(2.425,-0.875) 30(2.425,-0.525) 31(2.425,-0.175) 32(2.425,0.175) 33(2.425,0.525) 34(2.425,0.875) 35(2.425,1.225) 36(2.425,1.575) 37(2.425,1.925) 38(2.425,2.275)
  oval 0.2x0.8 smd: 15(-1.575,-2.425) 16(-1.225,-2.425) 17(-0.875,-2.425) 18(-0.525,-2.425) 19(-0.175,-2.425) 20(0.175,-2.425) 21(0.525,-2.425) 22(0.875,-2.425) 23(1.225,-2.425) 24(1.575,-2.425)
  oval 0.2x0.8 smd paste-0.1: 39(1.575,2.425) 40(1.225,2.425) 41(0.875,2.425) 42(0.525,2.425) 43(0.175,2.425) 44(-0.175,2.425) 45(-0.525,2.425) 46(-0.875,2.425) 47(-1.225,2.425) 48(-1.575,2.425)
  rect 3.7x3.7 smd paste-1.85: 49(0,0)
Top Overlay:
  circle w0.25: c-2.975,2.975 r0.125
Top Paste:
  rectangle: -1.6,0.2 -0.2,1.6
  region: -0.21,-1.593 -0.21,-0.193 -1.61,-0.193 -1.61,-1.593
  region: 1.584,-0.187 0.184,-0.187 0.184,-1.587 1.584,-1.587
  region: 0.2,1.6 0.2,0.2 1.6,0.2 1.6,1.6
  lines w0.2: -1.576,2.42 -1.576,2.72 ; -1.224,2.13 -1.224,2.43 ; -0.876,2.42 -0.876,2.72 ; -0.524,2.13 -0.524,2.43 ; -0.176,2.42 -0.176,2.72 ; 0.176,2.13 0.176,2.43 ; 0.524,2.42 0.524,2.72 ; 0.876,2.13 0.876,2.43 ; 1.224,2.42 1.224,2.72 ; 1.576,2.13 1.576,2.43
Top M11-12_SMOT:
  circle w0.2: c-1.625,1.625 r0.2
  rectangle: -1.65,2.15 -1.5,2.603
  rectangle: -1.3,2.15 -1.15,2.603
  rectangle: -0.95,2.15 -0.8,2.603
  rectangle: -0.6,2.15 -0.45,2.603
  rectangle: -0.25,2.15 -0.1,2.603
  rectangle: 0.1,2.15 0.25,2.603
  rectangle: 0.45,2.15 0.6,2.603
  rectangle: 0.8,2.15 0.95,2.603
  rectangle: 1.15,2.15 1.3,2.603
  rectangle: 1.5,2.15 1.65,2.603
  region: 2.15,2.35 2.15,2.2 2.603,2.2 2.603,2.35
  region: 2.15,2 2.15,1.85 2.603,1.85 2.603,2
  region: 2.15,1.65 2.15,1.5 2.603,1.5 2.603,1.65
  region: 2.15,1.3 2.15,1.15 2.603,1.15 2.603,1.3
  region: 2.15,0.95 2.15,0.8 2.603,0.8 2.603,0.95
  region: 2.15,0.6 2.15,0.45 2.603,0.45 2.603,0.6
  region: 2.15,0.25 2.15,0.1 2.603,0.1 2.603,0.25
  region: 2.15,-0.1 2.15,-0.25 2.603,-0.25 2.603,-0.1
  region: 2.15,-0.45 2.15,-0.6 2.603,-0.6 2.603,-0.45
  region: 2.15,-0.8 2.15,-0.95 2.603,-0.95 2.603,-0.8
  region: 2.15,-1.15 2.15,-1.3 2.603,-1.3 2.603,-1.15
  region: 2.15,-1.5 2.15,-1.65 2.603,-1.65 2.603,-1.5
  region: 2.15,-1.85 2.15,-2 2.603,-2 2.603,-1.85
  region: 2.15,-2.2 2.15,-2.35 2.603,-2.35 2.603,-2.2
  region: 1.65,-2.15 1.5,-2.15 1.5,-2.603 1.65,-2.603
  region: 1.3,-2.15 1.15,-2.15 1.15,-2.603 1.3,-2.603
  region: 0.95,-2.15 0.8,-2.15 0.8,-2.603 0.95,-2.603
  region: 0.6,-2.15 0.45,-2.15 0.45,-2.603 0.6,-2.603
  region: 0.25,-2.15 0.1,-2.15 0.1,-2.603 0.25,-2.603
  region: -0.1,-2.15 -0.25,-2.15 -0.25,-2.603 -0.1,-2.603
  region: -0.45,-2.15 -0.6,-2.15 -0.6,-2.603 -0.45,-2.603
  region: -0.8,-2.15 -0.95,-2.15 -0.95,-2.603 -0.8,-2.603
  region: -1.15,-2.15 -1.3,-2.15 -1.3,-2.603 -1.15,-2.603
  region: -1.5,-2.15 -1.65,-2.15 -1.65,-2.603 -1.5,-2.603
  region: -2.15,-2.35 -2.15,-2.2 -2.603,-2.2 -2.603,-2.35
  region: -2.15,-2 -2.15,-1.85 -2.603,-1.85 -2.603,-2
  region: -2.15,-1.65 -2.15,-1.5 -2.603,-1.5 -2.603,-1.65
  region: -2.15,-1.3 -2.15,-1.15 -2.603,-1.15 -2.603,-1.3
  region: -2.15,-0.95 -2.15,-0.8 -2.603,-0.8 -2.603,-0.95
  region: -2.15,-0.6 -2.15,-0.45 -2.603,-0.45 -2.603,-0.6
  region: -2.15,-0.25 -2.15,-0.1 -2.603,-0.1 -2.603,-0.25
  region: -2.15,0.1 -2.15,0.25 -2.603,0.25 -2.603,0.1
  region: -2.15,0.45 -2.15,0.6 -2.603,0.6 -2.603,0.45
  region: -2.15,0.8 -2.15,0.95 -2.603,0.95 -2.603,0.8
  region: -2.15,1.15 -2.15,1.3 -2.603,1.3 -2.603,1.15
  region: -2.15,1.5 -2.15,1.65 -2.603,1.65 -2.603,1.5
  region: -2.15,1.85 -2.15,2 -2.603,2 -2.603,1.85
  region: -2.15,2.2 -2.15,2.35 -2.603,2.35 -2.603,2.2
  lines w0.1: -2.6,-2.6 -2.6,2.6 2.6,2.6 2.6,-2.6 -2.6,-2.6
Top M13-14_SDES:
  text "'.Designator'" at -4.532,-0.333 h0.8
Top M15-16_SORG:
  lines w0.05: -3.075,-3.075 -3.075,3.075 3.075,3.075 3.075,-3.075 -3.075,-3.075
  lines w0.1: -0.5,0 0.5,0 ; 0,-0.5 0,0.5
3D body "QFN48_5_5_v1.step": height 0.9, standoff 0, extent -2.575,-2.575 2.575,2.575

## QFN64_A001 [mm] "GECO SILICON LABS"
height 0.8
pads (65):
  rrect50% 0.8x0.25 smd paste-0.126: 1(-4.425,3.75) 16(-4.425,-3.75) 33(4.425,-3.75) 48(4.425,3.75)
  rrect50% 0.85x0.25 smd paste-0.126: 2(-4.4,3.25) 3(-4.4,2.75) 4(-4.4,2.25) 5(-4.4,1.75) 6(-4.4,1.25) 7(-4.4,0.75) 8(-4.4,0.25) 9(-4.4,-0.25) 10(-4.4,-0.75) 11(-4.4,-1.25) 12(-4.4,-1.75) 13(-4.4,-2.25) 14(-4.4,-2.75) 15(-4.4,-3.25) 34(4.4,-3.25) 35(4.4,-2.75) 36(4.4,-2.25) 37(4.4,-1.75) 38(4.4,-1.25) 39(4.4,-0.75) 40(4.4,-0.25) 41(4.4,0.25) 42(4.4,0.75) 43(4.4,1.25) 44(4.4,1.75) 45(4.4,2.25) 46(4.4,2.75) 47(4.4,3.25)
  rrect50% 0.25x0.8 smd paste-0.126: 17(-3.75,-4.425) 32(3.75,-4.425) 49(3.75,4.425) 64(-3.75,4.425)
  rrect50% 0.25x0.85 smd paste-0.126: 18(-3.25,-4.4) 19(-2.75,-4.4) 20(-2.25,-4.4) 21(-1.75,-4.4) 22(-1.25,-4.4) 23(-0.75,-4.4) 24(-0.25,-4.4) 25(0.25,-4.4) 26(0.75,-4.4) 27(1.25,-4.4) 28(1.75,-4.4) 29(2.25,-4.4) 30(2.75,-4.4) 31(3.25,-4.4) 50(3.25,4.4) 51(2.75,4.4) 52(2.25,4.4) 53(1.75,4.4) 54(1.25,4.4) 55(0.75,4.4) 56(0.25,4.4) 57(-0.25,4.4) 58(-0.75,4.4) 59(-1.25,4.4) 60(-1.75,4.4) 61(-2.25,4.4) 62(-2.75,4.4) 63(-3.25,4.4)
  rect 7.2x7.2 smd paste-3.7: 65(0,0)
Top Overlay:
  circle w0.25: c-5.3,4.5 r0.125
  lines w0.2: -4.65,-4.275 -4.65,-4.65 -4.275,-4.65 ; -4.65,4.275 -4.65,4.65 -4.275,4.65 ; 4.275,-4.65 4.65,-4.65 4.65,-4.275 ; 4.275,4.65 4.65,4.65 4.65,4.275
Top Paste:
  drawing of 70 lines, arcs and shapes, not listed
Top M11-12_SMOT:
  circle w0.2: c-3.5,3.5 r0.2
  region: 4.137,-3.667 4.137,-3.838 4.59,-3.838 4.59,-3.667
  region: 4.134,-3.16 4.134,-3.332 4.587,-3.332 4.587,-3.16
  region: 4.134,-2.66 4.134,-2.832 4.587,-2.832 4.587,-2.66
  region: 4.134,-2.16 4.134,-2.332 4.587,-2.332 4.587,-2.16
  region: 4.134,-1.66 4.134,-1.832 4.587,-1.832 4.587,-1.66
  region: 4.134,-1.16 4.134,-1.332 4.587,-1.332 4.587,-1.16
  region: 4.134,-0.66 4.134,-0.832 4.587,-0.832 4.587,-0.66
  region: 4.134,-0.16 4.134,-0.332 4.587,-0.332 4.587,-0.16
  region: 4.134,0.34 4.134,0.168 4.587,0.168 4.587,0.34
  region: 4.134,0.84 4.134,0.668 4.587,0.668 4.587,0.84
  region: 4.134,1.34 4.134,1.168 4.587,1.168 4.587,1.34
  region: 4.134,1.84 4.134,1.668 4.587,1.668 4.587,1.84
  region: 4.134,2.34 4.134,2.168 4.587,2.168 4.587,2.34
  region: 4.134,2.84 4.134,2.668 4.587,2.668 4.587,2.84
  region: 4.134,3.34 4.134,3.168 4.587,3.168 4.587,3.34
  region: 4.138,3.842 4.138,3.67 4.591,3.67 4.591,3.842
  region: -3.667,-4.137 -3.838,-4.137 -3.838,-4.59 -3.667,-4.59
  region: -3.16,-4.134 -3.332,-4.134 -3.332,-4.587 -3.16,-4.587
  region: -2.66,-4.134 -2.832,-4.134 -2.832,-4.587 -2.66,-4.587
  region: -2.16,-4.134 -2.332,-4.134 -2.332,-4.587 -2.16,-4.587
  region: -1.66,-4.134 -1.832,-4.134 -1.832,-4.587 -1.66,-4.587
  region: -1.16,-4.134 -1.332,-4.134 -1.332,-4.587 -1.16,-4.587
  region: -0.66,-4.134 -0.832,-4.134 -0.832,-4.587 -0.66,-4.587
  region: -0.16,-4.134 -0.332,-4.134 -0.332,-4.587 -0.16,-4.587
  region: 0.34,-4.134 0.168,-4.134 0.168,-4.587 0.34,-4.587
  region: 0.84,-4.134 0.668,-4.134 0.668,-4.587 0.84,-4.587
  region: 1.34,-4.134 1.168,-4.134 1.168,-4.587 1.34,-4.587
  region: 1.84,-4.134 1.668,-4.134 1.668,-4.587 1.84,-4.587
  region: 2.34,-4.134 2.168,-4.134 2.168,-4.587 2.34,-4.587
  region: 2.84,-4.134 2.668,-4.134 2.668,-4.587 2.84,-4.587
  region: 3.34,-4.134 3.168,-4.134 3.168,-4.587 3.34,-4.587
  region: 3.842,-4.138 3.67,-4.138 3.67,-4.591 3.842,-4.591
  region: -4.137,3.667 -4.137,3.838 -4.59,3.838 -4.59,3.667
  region: -4.134,3.16 -4.134,3.332 -4.587,3.332 -4.587,3.16
  region: -4.134,2.66 -4.134,2.832 -4.587,2.832 -4.587,2.66
  region: -4.134,2.16 -4.134,2.332 -4.587,2.332 -4.587,2.16
  region: -4.134,1.66 -4.134,1.832 -4.587,1.832 -4.587,1.66
  region: -4.134,1.16 -4.134,1.332 -4.587,1.332 -4.587,1.16
  region: -4.134,0.66 -4.134,0.832 -4.587,0.832 -4.587,0.66
  region: -4.134,0.16 -4.134,0.332 -4.587,0.332 -4.587,0.16
  region: -4.134,-0.34 -4.134,-0.168 -4.587,-0.168 -4.587,-0.34
  region: -4.134,-0.84 -4.134,-0.668 -4.587,-0.668 -4.587,-0.84
  region: -4.134,-1.34 -4.134,-1.168 -4.587,-1.168 -4.587,-1.34
  region: -4.134,-1.84 -4.134,-1.668 -4.587,-1.668 -4.587,-1.84
  region: -4.134,-2.34 -4.134,-2.168 -4.587,-2.168 -4.587,-2.34
  region: -4.134,-2.84 -4.134,-2.668 -4.587,-2.668 -4.587,-2.84
  region: -4.134,-3.34 -4.134,-3.168 -4.587,-3.168 -4.587,-3.34
  region: -4.138,-3.842 -4.138,-3.67 -4.591,-3.67 -4.591,-3.842
  rectangle: 3.667,4.137 3.838,4.59
  rectangle: 3.16,4.134 3.332,4.587
  rectangle: 2.66,4.134 2.832,4.587
  rectangle: 2.16,4.134 2.332,4.587
  rectangle: 1.66,4.134 1.832,4.587
  rectangle: 1.16,4.134 1.332,4.587
  rectangle: 0.66,4.134 0.832,4.587
  rectangle: 0.16,4.134 0.332,4.587
  rectangle: -0.34,4.134 -0.168,4.587
  rectangle: -0.84,4.134 -0.668,4.587
  rectangle: -1.34,4.134 -1.168,4.587
  rectangle: -1.84,4.134 -1.668,4.587
  rectangle: -2.34,4.134 -2.168,4.587
  rectangle: -2.84,4.134 -2.668,4.587
  rectangle: -3.34,4.134 -3.168,4.587
  rectangle: -3.842,4.138 -3.67,4.591
  lines w0.1: -4.5,-4.5 -4.5,4.5 4.5,4.5 4.5,-4.5 -4.5,-4.5
Top M13-14_SDES:
  text "'.Designator'" at -4.532,-0.333 h0.8
Top M15-16_SORG:
  lines w0.05: -5,-5 5,-5 5,5 -5,5 -5,-5
  lines w0.1: -0.5,0 0.5,0 ; 0,-0.5 0,0.5
3D body "QFN64_A001.step": height 0.8, standoff 0, extent -4.55,-4.55 4.55,4.55

## QFN-32_A01 [mm] "ATSAML10"
height 0.9
pads (33):
  rrect50% 0.65x0.3 smd: 1(-2.3,1.75) 2(-2.3,1.25) 3(-2.3,0.75) 4(-2.3,0.25) 5(-2.3,-0.25) 6(-2.3,-0.75) 7(-2.3,-1.25) 8(-2.3,-1.75) 17(2.3,-1.75) 18(2.3,-1.25) 19(2.3,-0.75) 20(2.3,-0.25) 21(2.3,0.25) 22(2.3,0.75) 23(2.3,1.25) 24(2.3,1.75)
  rrect50% 0.3x0.65 smd: 9(-1.75,-2.3) 10(-1.25,-2.3) 11(-0.75,-2.3) 12(-0.25,-2.3) 13(0.25,-2.3) 14(0.75,-2.3) 15(1.25,-2.3) 16(1.75,-2.3) 25(1.75,2.3) 26(1.25,2.3) 27(0.75,2.3) 28(0.25,2.3) 29(-0.25,2.3) 30(-0.75,2.3) 31(-1.25,2.3) 32(-1.75,2.3)
  rect 3.6x3.6 smd: 33(0,0)
via 1.1,-1.1 diameter 0.5 hole 0.2
via 0,-1.1 diameter 0.5 hole 0.2
via -1.1,-1.1 diameter 0.5 hole 0.2
via 1.1,0 diameter 0.5 hole 0.2
via 0,0 diameter 0.5 hole 0.2
via -1.1,0 diameter 0.5 hole 0.2
via 1.1,1.1 diameter 0.5 hole 0.2
via 0,1.1 diameter 0.5 hole 0.2
via -1.1,1.1 diameter 0.5 hole 0.2
Top Overlay:
  circle w0.25: c-3.15,2.35 r0.125
  lines w0.2: -2.5,-2.375 -2.5,-2.5 -2.375,-2.5 ; -2.5,2.375 -2.5,2.5 -2.375,2.5 ; 2.375,-2.5 2.5,-2.5 2.5,-2.375 ; 2.375,2.5 2.5,2.5 2.5,2.375
Top M11-12_SMOT:
  circle w0.2: c-2.2,2.2 r0.1
  region: -1.899,2.5 -1.899,2.05 -1.599,2.05 -1.599,2.5
  region: -1.399,2.5 -1.399,2.05 -1.099,2.05 -1.099,2.5
  region: -0.899,2.5 -0.899,2.05 -0.599,2.05 -0.599,2.5
  region: -0.399,2.5 -0.399,2.05 -0.099,2.05 -0.099,2.5
  region: 0.101,2.5 0.101,2.05 0.401,2.05 0.401,2.5
  region: 0.601,2.5 0.601,2.05 0.901,2.05 0.901,2.5
  region: 1.101,2.5 1.101,2.05 1.401,2.05 1.401,2.5
  rectangle: -2.5,-1.404 -2.05,-1.104
  rectangle: -2.5,-0.904 -2.05,-0.604
  rectangle: -2.5,-0.404 -2.05,-0.104
  rectangle: -2.5,0.096 -2.05,0.396
  rectangle: -2.5,0.596 -2.05,0.896
  rectangle: -2.5,1.096 -2.05,1.396
  rectangle: -2.5,1.596 -2.05,1.896
  region: 1.895,-2.5 1.895,-2.05 1.595,-2.05 1.595,-2.5
  region: 1.395,-2.5 1.395,-2.05 1.095,-2.05 1.095,-2.5
  region: 0.895,-2.5 0.895,-2.05 0.595,-2.05 0.595,-2.5
  region: 0.395,-2.5 0.395,-2.05 0.095,-2.05 0.095,-2.5
  region: -0.105,-2.5 -0.105,-2.05 -0.405,-2.05 -0.405,-2.5
  region: -0.605,-2.5 -0.605,-2.05 -0.905,-2.05 -0.905,-2.5
  region: -1.105,-2.5 -1.105,-2.05 -1.405,-2.05 -1.405,-2.5
  region: 2.5,1.899 2.05,1.899 2.05,1.599 2.5,1.599
  region: 2.5,1.399 2.05,1.399 2.05,1.099 2.5,1.099
  region: 2.5,0.899 2.05,0.899 2.05,0.599 2.5,0.599
  region: 2.5,0.399 2.05,0.399 2.05,0.099 2.5,0.099
  region: 2.5,-0.101 2.05,-0.101 2.05,-0.401 2.5,-0.401
  region: 2.5,-0.601 2.05,-0.601 2.05,-0.901 2.5,-0.901
  region: 2.5,-1.101 2.05,-1.101 2.05,-1.401 2.5,-1.401
  rectangle: -1.6,-1.6 1.6,1.6
  region: 1.6,2.5 1.6,2.05 1.9,2.05 1.9,2.5
  region: -1.605,-2.5 -1.605,-2.05 -1.905,-2.05 -1.905,-2.5
  rectangle: -2.5,-1.904 -2.05,-1.604
  region: 2.5,-1.601 2.05,-1.601 2.05,-1.901 2.5,-1.901
  lines w0.1: -2.5,-2.5 2.5,-2.5 2.5,2.5 -2.5,2.5 -2.5,-2.5
Top M13-14_SDES:
  text "'.Designator'" at -4.532,-0.333 h0.8
Top M15-16_SORG:
  lines w0.05: -2.8,-2.8 2.8,-2.8 2.8,2.8 -2.8,2.8 -2.8,-2.8
  lines w0.1: -0.5,0 0.5,0 ; 0,-0.5 0,0.5
3D body "QFN-32.step": height 0.9, standoff 0, extent -2.5,-2.5 2.5,2.5

## QFN_16_3x3_A001 [mm] "CMOSTEK"
height 0.8
pads (17):
  oval 0.7x0.25 smd paste-0.05 mask+0.1: 1(-1.35,0.75) 2(-1.35,0.25) 3(-1.35,-0.25) 4(-1.35,-0.75) 9(1.35,-0.75) 10(1.35,-0.25) 11(1.35,0.25) 12(1.35,0.75)
  oval 0.25x0.7 smd paste-0.05 mask+0.1: 5(-0.75,-1.35) 6(-0.25,-1.35) 7(0.25,-1.35) 8(0.75,-1.35) 13(0.75,1.35) 14(0.25,1.35) 15(-0.25,1.35) 16(-0.75,1.35)
  rect 1.6x1.6 smd paste-0.1 mask+0.1: 17(0,0)
Top Overlay:
  circle w0.25: c-2.35,1.55 r0.125
  lines w0.2: -1.7,-1.275 -1.7,-1.7 -1.275,-1.7 ; -1.7,1.275 -1.7,1.7 -1.275,1.7 ; 1.275,-1.7 1.7,-1.7 1.7,-1.275 ; 1.275,1.7 1.7,1.7 1.7,1.275
Top Solder:
  region: -0.8,-0.8 -0.8,-1.8 0.8,-1.8 0.8,-0.8
  region: -0.8,0.8 -1.8,0.8 -1.8,-0.8 -0.8,-0.8
  region: 0.8,0.8 0.8,1.8 -0.8,1.8 -0.8,0.8
  rectangle: 0.8,-0.8 1.8,0.8
  region: 1.118,-0.974 1.114,-0.974 1.088,-0.976 1.038,-0.997 1.001,-1.035 0.98,-1.084 0.978,-1.111 0.978,-1.1 0.7,-1.1 0.7,-0.6 1.119,-0.6
  region: -0.974,-1.118 -0.974,-1.114 -0.976,-1.088 -0.997,-1.038 -1.035,-1.001 -1.084,-0.98 -1.111,-0.978 -1.1,-0.978 -1.1,-0.7 -0.6,-0.7 -0.6,-1.119
  region: -1.118,0.974 -1.114,0.974 -1.088,0.976 -1.038,0.997 -1.001,1.035 -0.98,1.084 -0.978,1.111 -0.978,1.1 -0.7,1.1 -0.7,0.6 -1.119,0.6
  region: 0.974,1.118 0.974,1.114 0.976,1.088 0.997,1.038 1.035,1.001 1.084,0.98 1.111,0.978 1.1,0.978 1.1,0.7 0.6,0.7 0.6,1.119
Top M11-12_SMOT:
  circle w0.25: c-1.2,1.2 r0.125
  region: -1.24,0.65 -1.24,0.85 -1.575,0.85 -1.575,0.65
  region: -1.24,0.15 -1.24,0.35 -1.575,0.35 -1.575,0.15
  region: -1.24,-0.35 -1.24,-0.15 -1.575,-0.15 -1.575,-0.35
  region: -1.24,-0.85 -1.24,-0.65 -1.575,-0.65 -1.575,-0.85
  region: -0.65,-1.24 -0.85,-1.24 -0.85,-1.575 -0.65,-1.575
  region: -0.15,-1.24 -0.35,-1.24 -0.35,-1.575 -0.15,-1.575
  region: 0.35,-1.24 0.15,-1.24 0.15,-1.575 0.35,-1.575
  region: 0.85,-1.24 0.65,-1.24 0.65,-1.575 0.85,-1.575
  region: 1.24,-0.65 1.24,-0.85 1.575,-0.85 1.575,-0.65
  region: 1.24,-0.15 1.24,-0.35 1.575,-0.35 1.575,-0.15
  region: 1.24,0.35 1.24,0.15 1.575,0.15 1.575,0.35
  region: 1.24,0.85 1.24,0.65 1.575,0.65 1.575,0.85
  rectangle: 0.65,1.24 0.85,1.575
  rectangle: 0.15,1.24 0.35,1.575
  rectangle: -0.35,1.24 -0.15,1.575
  rectangle: -0.85,1.24 -0.65,1.575
  lines w0.2: -1.6,-1.6 -1.6,1.6 1.6,1.6 1.6,-1.6 -1.6,-1.6
Top M13-14_SDES:
  text "'.Designator'" at -4.532,-0.333 h0.8
Top M15-16_SORG:
  lines w0.05: -2.1,-2.1 -2.1,2.1 2.1,2.1 2.1,-2.1 -2.1,-2.1
  lines w0.1: -0.5,0 0.5,0 ; 0,-0.5 0,0.5
3D body "QFN_16_3x3_A001.step": height 0.8, standoff 0, extent -1.6,-1.6 1.6,1.6